# Altium footprint library THU VIEN PCB.PCBLib: 534 footprints (part 1 of 34)
Each footprint in its own frame and in the unit in brackets; x right, y up, seen from the top. Pads: shape width x height; smd on the part's side, far side on the other; paste and mask are expansions set on the pad; w line width, h text height; cw(c..) or ccw(c..) is an arc to the next point about the centre after c.
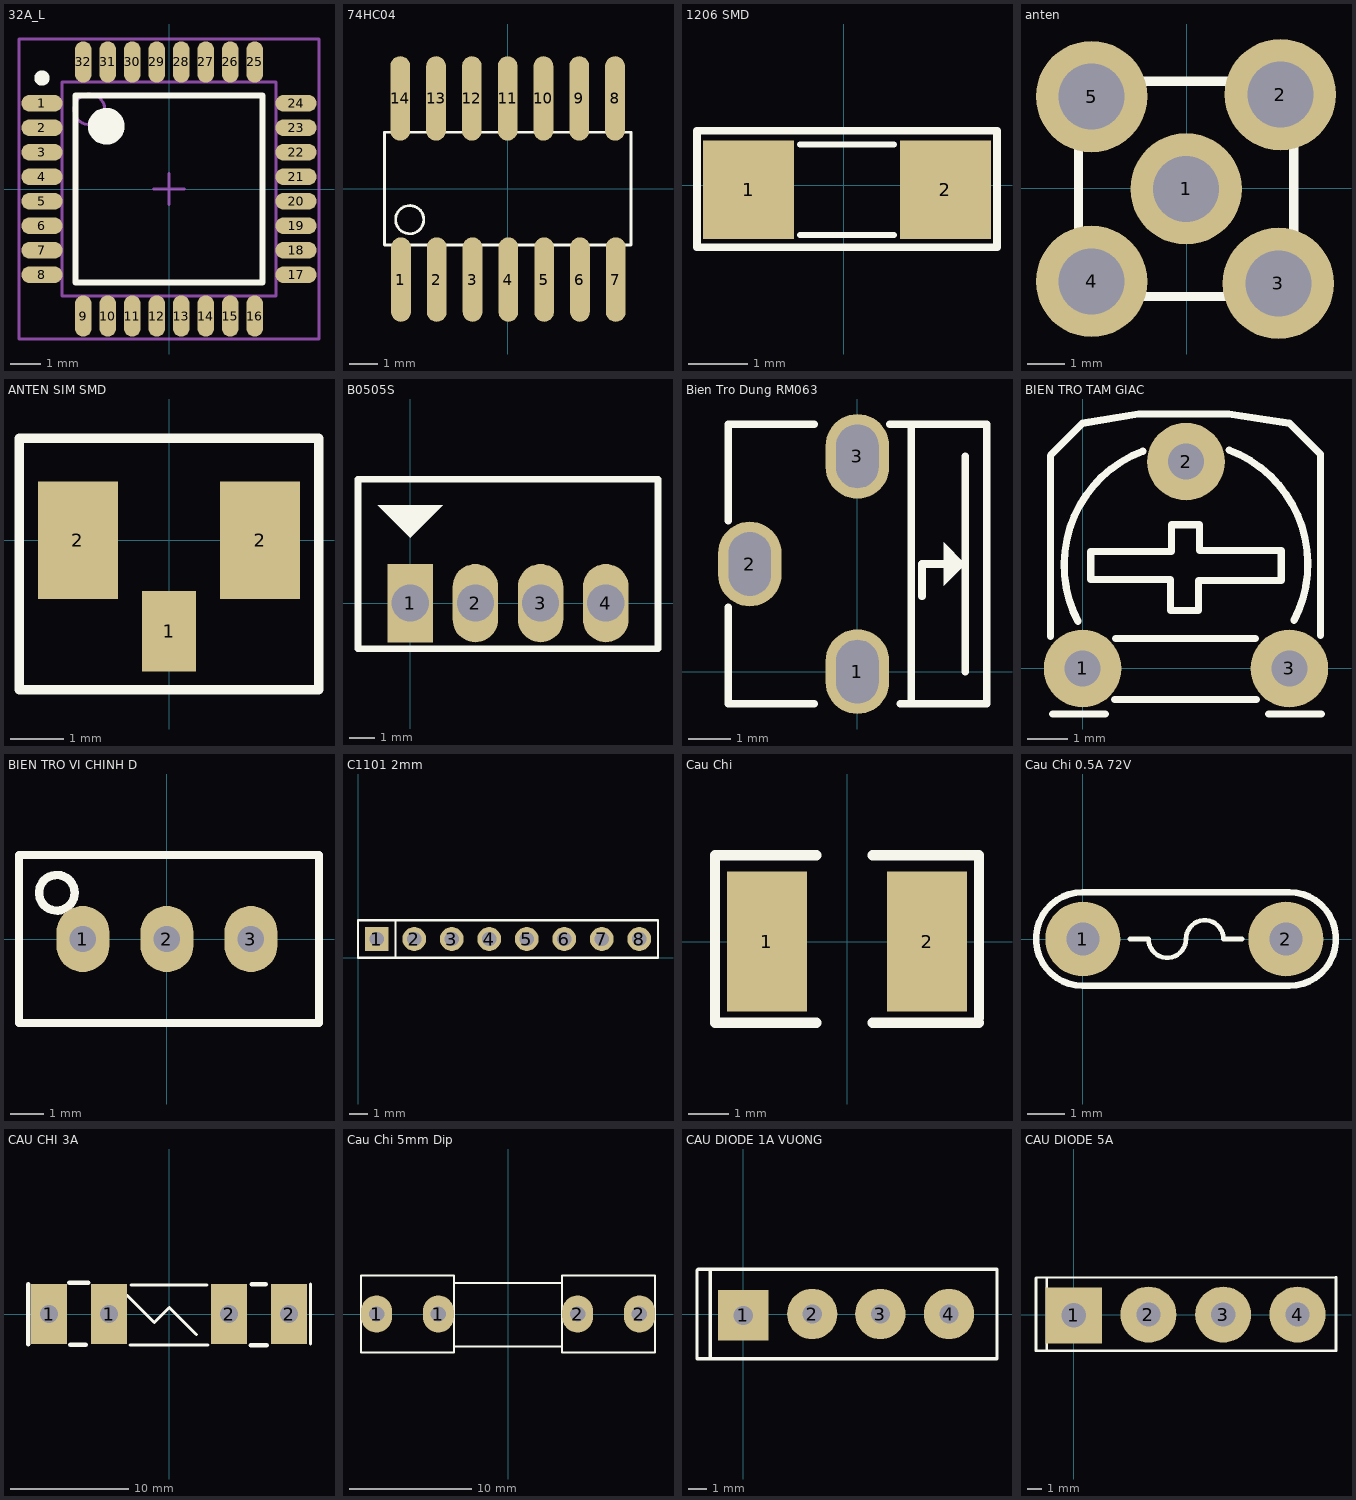
[diagram p0: the footprints below, top view; thin cyan lines are the x and y axes]

## 32A_L [mm] "Thin QFP, 32-Leads, Body 7x7mm, Pitch 0.8mm, IPC High Density"
height 1.2
pads (32):
  oval 1.35x0.55 smd: 1(-4.15,2.8) 2(-4.15,2) 3(-4.15,1.2) 4(-4.15,0.4) 5(-4.15,-0.4) 6(-4.15,-1.2) 7(-4.15,-2) 8(-4.15,-2.8) 17(4.15,-2.8) 18(4.15,-2) 19(4.15,-1.2) 20(4.15,-0.4) 21(4.15,0.4) 22(4.15,1.2) 23(4.15,2) 24(4.15,2.8)
  oval 0.55x1.35 smd: 9(-2.8,-4.15) 10(-2,-4.15) 11(-1.2,-4.15) 12(-0.4,-4.15) 13(0.4,-4.15) 14(1.2,-4.15) 15(2,-4.15) 16(2.8,-4.15) 25(2.8,4.15) 26(2,4.15) 27(1.2,4.15) 28(0.4,4.15) 29(-0.4,4.15) 30(-1.2,4.15) 31(-2,4.15) 32(-2.8,4.15)
Top Overlay:
  circle w0.6: c-2.05,2.05 r0.3
  circle w0.25: c-4.15,3.625 r0.125
  lines w0.2: -3.05,-3.05 3.05,-3.05 3.05,3.05 -3.05,3.05 -3.05,-3.05
Mechanical 13:
  circle w0.1: c-2.6,2.6 r0.5
  lines w0.1: -3.5,-3.5 3.5,-3.5 3.5,3.5 -3.5,3.5 -3.5,-3.5
Mechanical 15:
  lines w0.1: -0.5,0 0.5,0 ; 0,-0.5 0,0.5 ; -4.9,-4.9 4.9,-4.9 4.9,4.9 -4.9,4.9 -4.9,-4.9
3D body "LQFP32-0_8.step": height 1.36, standoff -0.31, extent -4.521,-4.545 4.517,4.494

## 74HC04 [mm] "SOIC, 14-Leads, Body 8.7x3.9mm, Pitch 1.27mm, IPC Low Density"
height 1.75
pads (14):
  oval 0.7x3 smd: 1(-3.785,-3.226) 2(-2.515,-3.226) 3(-1.245,-3.226) 4(0.025,-3.226) 5(1.295,-3.226) 6(2.565,-3.226) 7(3.835,-3.226) 8(3.81,3.2) 9(2.54,3.2) 10(1.27,3.2) 11(0,3.2) 12(-1.27,3.2) 13(-2.54,3.2) 14(-3.81,3.2)
Top Layer:
  lines w0.254: 0,-3.2 0.025,-3.226
Top Overlay:
  circle w0.1: c-3.475,-1.1 r0.5
  lines w0.1: -4.375,-2 4.375,-2 4.375,2 -4.375,2 -4.375,-2
3D body "User Library-SOP14-p127-780.STEP": height 1.1, standoff 0, extent -5.08,-3.642 5.12,3.658

## 1206 SMD [mil]
pads (2):
  rect 60x65 smd: 1(-63,-3) 2(67,-3)
Top Overlay:
  lines w4: -29,-33 33,-33 ; -29,27 33,27
  lines w5: -97,-41 101,-41 101,36 -97,36 -97,-41
3D body "User Library-res1206.STEP": height 24.79, standoff 0, extent -80.68,-38 84.68,32.87

## anten [mil]
pads (5):
  round 118.11 hole 70: 1(-0.83,-0.83) 2(99,99) 3(97,-101) 4(-101,-99) 5(-101,97)
Top Overlay:
  lines w10: -115,-115 -115,105.47 -115,109.41 -115,113.35 113.35,113.35 113.35,-115 -115,-115
3D body "Anten GSM socket.step": height 375.4, standoff -186.41, extent -155,-192.4 156.81,182.4

## ANTEN SIM SMD [mm]
pads (3):
  rect 1x1.5 smd: 1(0,-1.7)
  rect 1.5x2.2 smd: 2(-1.7,0) 2(1.7,0)
Top Overlay:
  lines w0.178: -2.794,-2.794 2.794,-2.794 2.794,1.905 -2.667,1.905 -2.794,1.905 -2.794,-2.794
3D body "SW3dPS-UFL-R-SMD.STEP": height 1.25, standoff 0, extent -1.7,-1.55 1.7,1.55

## B0505S [mil]
pads (4):
  rect 70x120 hole 57: 1(0,0)
  oval 70x120 hole 57: 2(100,0) 3(200,0) 4(300,0)
Top Overlay:
  region: -50,150 50,150 0,100
  lines w10: -80,-70 -80,-60 -80,190 380,190 380,-70 -80,-70
3D body "B0505s.step": height 393.7, standoff -141.73, extent -76.38,-50 376.38,186.22

## Bien Tro Dung RM063 [mm]
pads (3):
  oval 1.5x2 hole 1 slot 1.5 at 90 deg: 1(0,0) 2(-2.54,2.54) 3(0,5.08)
Top Overlay:
  region: 2.032,3.048 2.032,2.032 2.54,2.54
  lines w0.178: -3.048,1.524 -3.048,-0.762 -1.016,-0.762 ; -3.048,3.556 -3.048,5.842 -1.016,5.842 ; 0.762,5.842 3.048,5.842 3.048,-0.762 1.016,-0.762 ; 1.27,-0.762 1.27,5.842 ; 1.524,1.778 1.524,2.54 2.032,2.54 ; 2.54,0 2.54,5.08
3D body "User Library-RM-063.STEP": height 9.5, standoff -1.81, extent -2.683,-0.71 2.946,5.79

## BIEN TRO TAM GIAC [mil] "Resistor Variable"
height 200
pads (3):
  round 75 hole 35: 1(0,0) 2(100,200) 3(200,0)
Top Overlay:
  lines w7: -31,31 -31,206 0,237 54,246 141.5,246 200,237 230,207 230,32 ; -29,-44 22,-44 ; -4.35,45.34 cw(c100,100) 58.1,210.1 ; 8,113 8,86 85,86 85,56 112,56 112,85 192,85 192,114 113,114 113,139 86,139 86,113 9,113 ; 31,-30 168,-30 ; 32,29 167,29 ; 141.9,211.1 cw(c100,101) 204.35,46.34 ; 180,-44 231,-44
3D body "Bien TroTam Giac.step": height 278.74, standoff -150.39, extent -27.95,-49.68 227.95,227.88

## BIEN TRO VI CHINH D [mm] "Bien tro vi chinh"
pads (3):
  oval 1.6x2 hole 0.8: 1(-2.54,0) 2(0,0) 3(2.54,0)
Top Overlay:
  circle w0.254: c-3.327,1.397 r0.539
  lines w0.254: -4.47,-2.54 -4.47,2.54 4.597,2.54 4.597,-2.54 -4.47,-2.54
3D body "User Library-Potenciometro Vertical.step": height 12.02, standoff -5.48, extent -4.537,-2.4 4.663,2.4

## C1101 2mm [mm]
pads (8):
  rect 1.27x1.27 hole 0.762: 1(1,1)
  round 1.27 hole 0.762: 2(3,1) 3(5,1) 4(7,1) 5(9,1) 6(11,1) 7(13,1) 8(15,1)
Top Overlay:
  lines w0.127: 2,0 2,2 ; 0,0 0,2 16,2 16,0 0,0
3D body: height 1.5, standoff 0, extent -0.01,0 2,2
3D body: height 1.5, standoff 0, extent 1.985,-0.01 3.995,1.99
3D body: height 1.5, standoff 0, extent 3.995,-0.03 6.005,1.97
3D body: height 1.5, standoff 0, extent 5.985,-0.02 7.995,1.98
3D body: height 1.5, standoff 0, extent 7.985,0.01 9.995,2.01
3D body: height 1.5, standoff 0, extent 9.995,0.01 12.005,2.01
3D body: height 1.5, standoff 0, extent 12.005,0.01 14.015,2.01
3D body: height 1.5, standoff 0, extent 14.005,0 16.015,2
3D body: height 7, standoff -1, extent 0.602,0.611 1.399,1.409
3D body: height 7, standoff -1, extent 2.744,0.684 3.54,1.482
3D body: height 7, standoff -1, extent 4.724,0.684 5.52,1.482
3D body: height 7, standoff -1, extent 6.724,0.704 7.52,1.502
3D body: height 7, standoff -1, extent 8.734,0.684 9.53,1.482
3D body: height 7, standoff -1, extent 10.724,0.674 11.52,1.472
3D body: height 7, standoff -1, extent 12.704,0.674 13.5,1.472
3D body: height 7, standoff -1, extent 14.744,0.684 15.54,1.482

## Cau Chi [mm] "Cau Tri"
pads (2):
  rect 2x3.5 smd: 1(-2,0) 2(2,0)
Top Overlay:
  lines w0.254: -0.762,-2.032 -3.302,-2.032 -3.302,2.159 -0.762,2.159 ; 0.635,-2.032 3.175,-2.032 ; 0.635,2.159 3.302,2.159 3.302,-1.905 ; 3.048,-2.032 3.302,-2.032
3D body "Fuse 1812L.step": height 1.34, standoff 0, extent -2.365,-1.705 2.365,1.705

## Cau Chi 0.5A 72V [mil] "Fuse"
pads (2):
  round 80 hole 35: 1(0,0) 2(216.54,0)
Top Overlay:
  lines w5: 50,0 70,0 ccw(c90,0) 110,0 cw(c130,0) 150,0 170,0
  lines w7: 0,-50 cw(c0,0) 0,50 220,50 cw(c220,0) 220,-50 0,-50
3D body "Cau Tri phuc hoiu 75V dip.STEP": height 446.06, standoff -132.28, extent -35.67,-60 255.67,58.11

## CAU CHI 3A [mil] "3A"
pads (4):
  rect 120x200 hole 60: 1(-400,0) 1(-200,0) 2(200,0) 2(400,0)
Top Overlay:
  lines w10: -469,-101 -469,99 ; -139,62 -49,-28 1,22 91,-68 ; -130,-103 130,-103 ; -127,97 127,97 ; 471,-100 471,100
  lines w15: -469,-101 -469,99 ; -333,104 -270,104 ; -330,-102 -277,-102 ; 273,-104 325,-104 ; 275,100 323,100
3D body: height 100, standoff 0, extent -335,-100 335,105

## Cau Chi 5mm Dip [mil] "De Fuse"
pads (4):
  oval 100x120 hole 50: 1(-425,0) 1(-225,0) 2(225,0) 2(425,0)
Top Overlay:
  lines w7: -175,-105 175,-105 ; -175,100 175,100 ; -475,-125 -175,-125 -175,125 -475,125 -475,-125 ; 175,-125 175,125 475,125 475,-125 175,-125
3D body "SW3dPS-Fuse Leg_2009.STEP": height 377.88, standoff -129.94, extent -448,-117 -208,126.71
3D body "SW3dPS-Fuse Small 1A.STEP": height 370.39, standoff 169.61, extent -384.8,-98 390.8,102.79
3D body "SW3dPS-Fuse Leg_2009.STEP": height 377.88, standoff -129.94, extent 219,-116.71 459,127

## CAU DIODE 1A VUONG [mil] "CAU 1A DET"
height 800
pads (4):
  rect 110x110 hole 42: 1(0,-2)
  round 110 hole 42: 2(151,1) 3(300,1) 4(450,1)
Top Overlay:
  lines w7: -72,-95 -72,99 ; -101,-97 -101,97 -99,99 555,99 555,-97 -101,-97
3D body "SW3dPS-KBPM.STEP": height 453.36, standoff -499.4, extent -61.99,-90 511.99,107.24

## CAU DIODE 5A [mil] "CAU 5A DET"
height 800
pads (4):
  rect 150x150 hole 65: 1(0,-2)
  round 150 hole 65: 2(200,0) 3(400,0) 4(599,0)
Top Overlay:
  lines w7: -72,-95 -72,99 ; -101,-97 702,-97 702,100 -99,99 -101,97 -101,-97
3D body "User Library-bridge 2.step": height 820.68, standoff -621.62, extent -138.98,-105 738.98,43.03